# Altium footprint library PcbLib1.PcbLib: 157 footprints (part 1 of 10)
Each footprint in its own frame and in the unit in brackets; x right, y up, seen from the top. Pads: shape width x height; smd on the part's side, far side on the other; paste and mask are expansions set on the pad; w line width, h text height; cw(c..) or ccw(c..) is an arc to the next point about the centre after c.
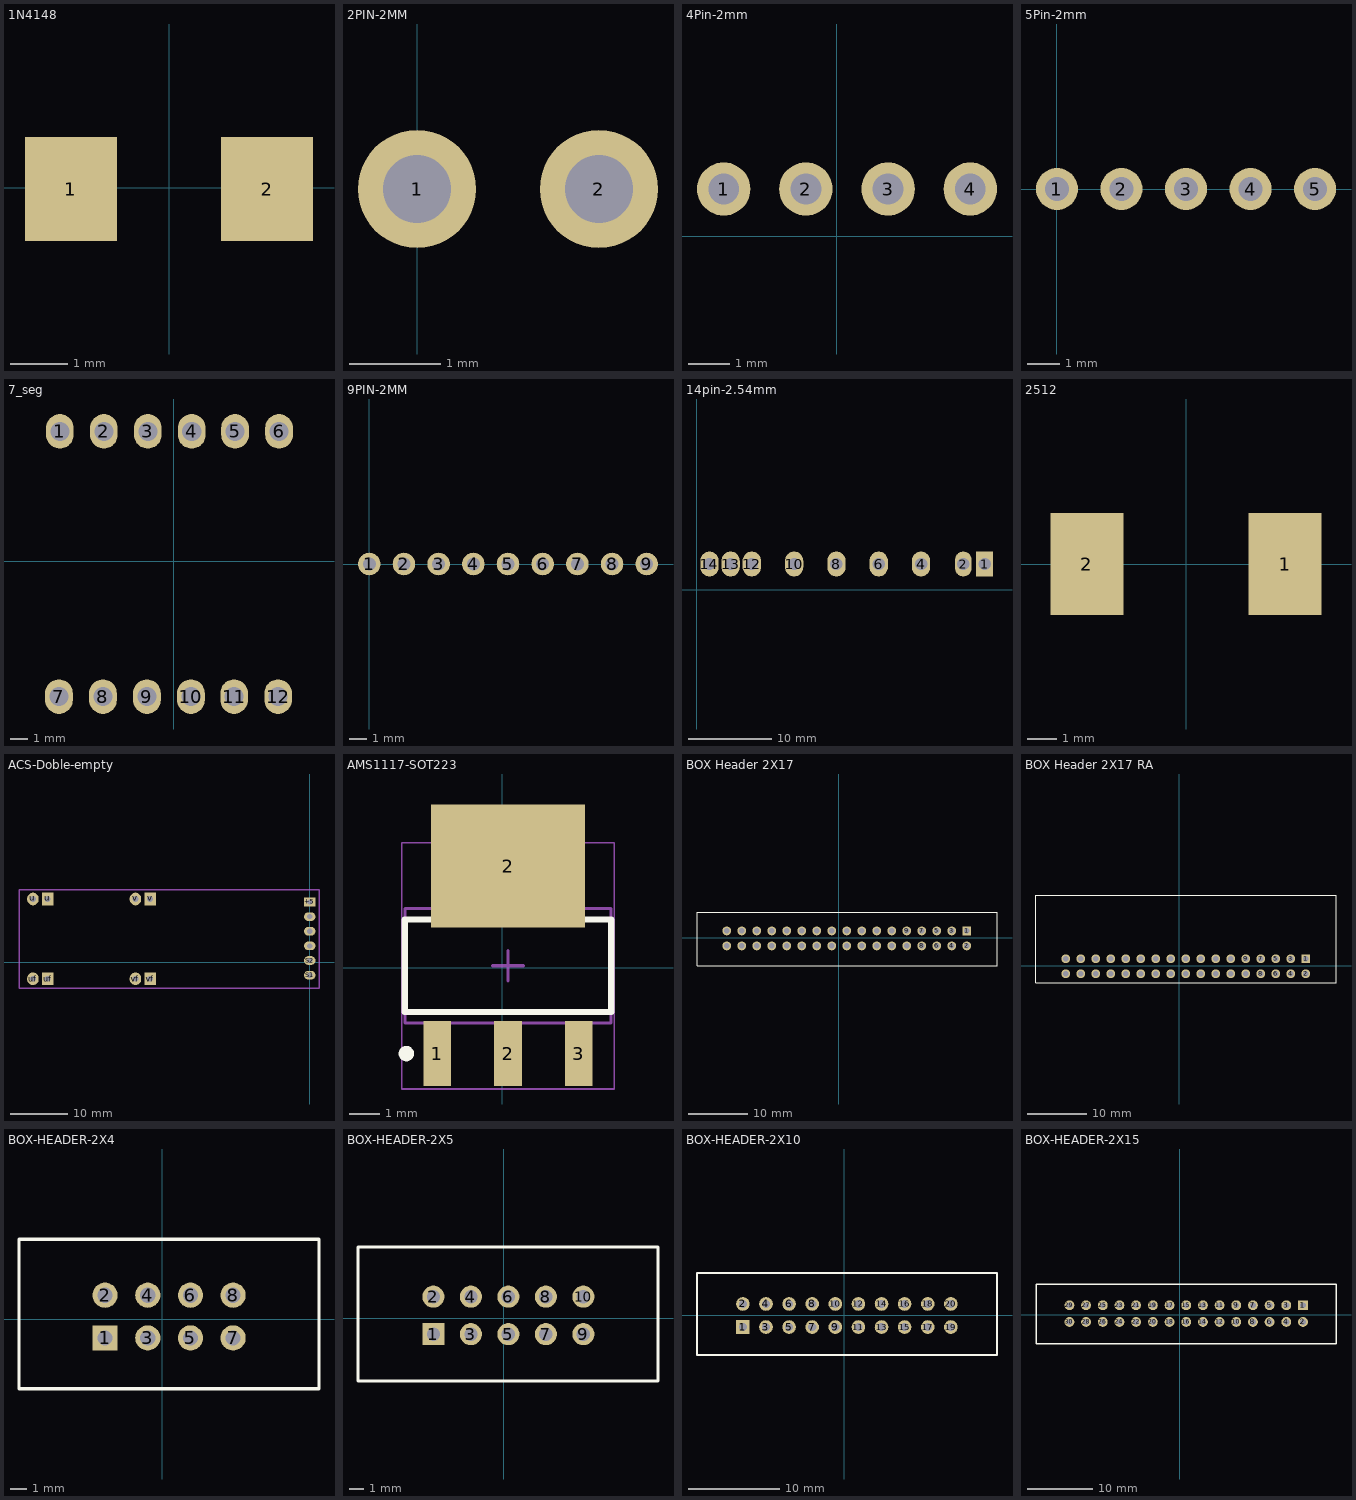
[diagram p0: the footprints below, top view; thin cyan lines are the x and y axes]

## 1N4148 [mm]
pads (2):
  rect 1.6x1.8 smd paste-25.4: 1(-1.7,-0.025) 2(1.7,-0.025)
3D body "User Library-MiniMelf-2.STEP": height 1.6, standoff 0, extent -1.85,-0.813 1.85,0.787

## 2PIN-2MM [mm]
pads (2):
  round 1.3 hole 0.75: 1(0,-1.95) 2(2,-1.95)

## 4Pin-2mm [mm]
pads (4):
  round 1.3 hole 0.75: 1(-2.75,1.15) 2(-0.75,1.15) 3(1.25,1.15) 4(3.25,1.15)

## 5Pin-2mm [mm]
pads (5):
  round 1.3 hole 0.75: 1(0,0) 2(2,0) 3(4,0) 4(6,0) 5(8,0)

## 7_seg [mm]
pads (12):
  oval 1.6x2 hole 1.1: 1(-6.58,7.5) 2(-4.04,7.5) 3(-1.5,7.5) 4(1.04,7.5) 5(3.54,7.5) 6(6.08,7.5) 7(-6.63,-7.825) 8(-4.09,-7.825) 9(-1.55,-7.825) 10(0.99,-7.825) 11(3.49,-7.825) 12(6.03,-7.825)
3D body "User Library-C-564 (7 segment 4 digit LED display).STEP": height 11, standoff -3.2, extent -25.425,-9.675 24.975,9.325

## 9PIN-2MM [mm]
pads (9):
  round 1.3 hole 0.75: 1(0,0) 2(2,0) 3(4,0) 4(6,0) 5(8,0) 6(10,0) 7(12,0) 8(14,0) 9(16,0)

## 14pin-2.54mm [mm]
pads (9):
  rect 2x3 hole 1.5: 1(34.574,3.085)
  oval 2x3 hole 1.5: 2(32.034,3.085)
  oval 2.2x3 hole 1.5: 4(26.954,3.085) 6(21.874,3.085) 8(16.794,3.085) 10(11.714,3.085) 12(6.634,3.085) 13(4.094,3.085) 14(1.554,3.085)

## 2512 [mm]
pads (2):
  rect 2.5x3.5 smd: 1(3.4,0) 2(-3.4,0)
3D body "User Library-Resistor SMD 2512.STEP": height 0.65, standoff 0, extent -3.2,-1.6 3.2,1.6

## ACS-Doble-empty [mm]
pads (14):
  rect 2x1.5 hole 0.9: +5(0,10.475)
  oval 2x1.5 hole 0.9: +15(0,5.395) -12(0,2.855) GND(0,7.935) S1(0,-2.225) S2(0,0.315)
  oval 2x2.2 hole 1: u(-48.011,10.988) uf(-48.011,-2.855) v(-30.231,10.988) vf(-30.231,-2.855)
  rect 2x2.2 hole 1: u(-45.471,10.988) uf(-45.471,-2.855) v(-27.691,10.988) vf(-27.691,-2.855)
Bottom Overlay:
  lines w0.2: -49.281,-4.125 -49.281,-1.585 -44.201,-1.585 -44.201,-4.125 -49.281,-4.125 ; -49.281,9.718 -49.281,12.258 -44.201,12.258 -44.201,9.718 -49.281,9.718 ; -31.501,-4.125 -31.501,-1.585 -26.421,-1.585 -26.421,-4.125 -31.501,-4.125 ; -31.501,9.718 -31.501,12.258 -26.421,12.258 -26.421,9.718 -31.501,9.718
Mechanical 13:
  lines w0.254: -50.424,-4.475 1.6,-4.475 1.6,12.575 -50.424,12.575 -50.424,-4.475
3D body "User Library-Header_Male_2Pin.STEP": height 8.54, standoff -3, extent -49.281,9.743 -44.201,12.233
3D body "User Library-Header_Male_2Pin.STEP": height 8.54, standoff -3, extent -49.281,-4.1 -44.201,-1.61
3D body "User Library-Header_Male_2Pin.STEP": height 8.54, standoff -3, extent -31.501,9.743 -26.421,12.233
3D body "User Library-Header_Male_2Pin.STEP": height 8.54, standoff -3, extent -31.501,-4.1 -26.421,-1.61

## AMS1117-SOT223 [mm]
pads (4):
  rect 0.9x2.1 smd: 1(-2.108,-2.789) 2(0.192,-2.789) 3(2.492,-2.789)
  rect 5x4 smd: 2(0.192,3.3)
Top Overlay:
  circle w0.25: c-3.108,-2.789 r0.125
  lines w0.2: -3.158,-1.439 3.542,-1.439 3.542,1.561 -3.158,1.561 -3.158,-1.439
Mechanical 13:
  lines w0.1: -3.158,-1.794 3.542,-1.794 3.542,1.916 -3.158,1.916 -3.158,-1.794
Mechanical 15:
  lines w0.05: -3.258,-3.939 3.642,-3.939 3.642,4.061 -3.258,4.061 -3.258,-3.939
  lines w0.1: -0.308,0.061 0.692,0.061 ; 0.192,-0.439 0.192,0.561
3D body "User Library-AMS1117-1.STEP": height 1.8, standoff -0.06, extent -3.074,-3.551 3.431,3.449

## BOX Header 2X17 [mm]
pads (34):
  rect 1.5x1.5 hole 0.9: 1(21.706,1.147)
  round 1.5 hole 0.9: 2(21.706,-1.393) 3(19.166,1.147) 4(19.166,-1.393) 5(16.626,1.147) 6(16.626,-1.393) 7(14.086,1.147) 8(14.086,-1.393) 9(11.546,1.147) 10(11.546,-1.393) 11(9.006,1.147) 12(9.006,-1.393) 13(6.466,1.147) 14(6.466,-1.393) 15(3.926,1.147) 16(3.926,-1.393) 17(1.386,1.147) 18(1.386,-1.393) 19(-1.154,1.147) 20(-1.154,-1.393) 21(-3.694,1.147) 22(-3.694,-1.393) 23(-6.234,1.147) 24(-6.234,-1.393) 25(-8.774,1.147) 26(-8.774,-1.393) 27(-11.314,1.147) 28(-11.314,-1.393) 29(-13.854,1.147) 30(-13.854,-1.393) 31(-16.394,1.147) 32(-16.394,-1.393) 33(-18.934,1.147) 34(-18.934,-1.393)
Top Overlay:
  lines w0.2: -23.975,-4.75 26.825,-4.75 26.825,4.3 -23.975,4.3 -23.975,-4.75
3D body "71071391.stp": height 9.43, standoff -2.68, extent -24.04,-4.825 26.8,4.275

## BOX Header 2X17 RA [mm]
pads (34):
  rect 1.5x1.5 hole 0.9: 1(21.406,1.197)
  round 1.5 hole 0.9: 2(21.406,-1.343) 3(18.866,1.197) 4(18.866,-1.343) 5(16.326,1.197) 6(16.326,-1.343) 7(13.786,1.197) 8(13.786,-1.343) 9(11.246,1.197) 10(11.246,-1.343) 11(8.706,1.197) 12(8.706,-1.343) 13(6.166,1.197) 14(6.166,-1.343) 15(3.626,1.197) 16(3.626,-1.343) 17(1.086,1.197) 18(1.086,-1.343) 19(-1.454,1.197) 20(-1.454,-1.343) 21(-3.994,1.197) 22(-3.994,-1.343) 23(-6.534,1.197) 24(-6.534,-1.343) 25(-9.074,1.197) 26(-9.074,-1.343) 27(-11.614,1.197) 28(-11.614,-1.343) 29(-14.154,1.197) 30(-14.154,-1.343) 31(-16.694,1.197) 32(-16.694,-1.343) 33(-19.234,1.197) 34(-19.234,-1.343)
Top Overlay:
  lines w0.2: -24.275,-2.825 -24.275,11.925 26.525,11.925 26.525,-2.825 -24.275,-2.825
3D body "71071384.stp": height 9.43, standoff -2.4, extent -24.315,-1.675 26.525,11.875

## BOX-HEADER-2X4 [mm]
pads (8):
  rect 1.5x1.5 hole 0.9: 1(-3.404,-1.122)
  round 1.5 hole 0.9: 2(-3.404,1.418) 3(-0.864,-1.122) 4(-0.864,1.418) 5(1.676,-1.122) 6(1.676,1.418) 7(4.216,-1.122) 8(4.216,1.418)
Top Overlay:
  lines w0.2: -8.525,-4.15 9.325,-4.15 9.325,4.75 -8.525,4.75 -8.525,-4.15
3D body "612008235121.stp": height 9.4, standoff -2.6, extent -8.495,-4.225 9.325,4.825

## BOX-HEADER-2X5 [mm]
pads (10):
  rect 1.5x1.5 hole 0.9: 1(-4.766,-1.091)
  round 1.5 hole 0.9: 2(-4.766,1.449) 3(-2.226,-1.091) 4(-2.226,1.449) 5(0.314,-1.091) 6(0.314,1.449) 7(2.854,-1.091) 8(2.854,1.449) 9(5.394,-1.091) 10(5.394,1.449)
Top Overlay:
  lines w0.2: -9.875,-4.25 -9.875,4.8 10.45,4.8 10.45,-4.25 -9.875,-4.25
3D body "612010235121.stp": height 9.4, standoff -2.6, extent -9.88,-4.225 10.48,4.825

## BOX-HEADER-2X10 [mm]
pads (20):
  rect 1.5x1.5 hole 0.9: 1(-11.159,-1.274)
  round 1.5 hole 0.9: 2(-11.159,1.266) 3(-8.619,-1.274) 4(-8.619,1.266) 5(-6.079,-1.274) 6(-6.079,1.266) 7(-3.539,-1.274) 8(-3.539,1.266) 9(-0.999,-1.274) 10(-0.999,1.266) 11(1.541,-1.274) 12(1.541,1.266) 13(4.081,-1.274) 14(4.081,1.266) 15(6.621,-1.274) 16(6.621,1.266) 17(9.161,-1.274) 18(9.161,1.266) 19(11.701,-1.274) 20(11.701,1.266)
Top Overlay:
  lines w0.2: -16.204,-4.35 16.775,-4.35 16.775,4.675 -16.204,4.675 -16.204,-4.35
3D body "612020235121.stp": height 9.4, standoff -2.6, extent -16.275,-4.375 16.785,4.675

## BOX-HEADER-2X15 [mm]
pads (30):
  rect 1.5x1.5 hole 0.9: 1(18.749,1.456)
  round 1.5 hole 0.9: 2(18.749,-1.084) 3(16.209,1.456) 4(16.209,-1.084) 5(13.669,1.456) 6(13.669,-1.084) 7(11.129,1.456) 8(11.129,-1.084) 9(8.589,1.456) 10(8.589,-1.084) 11(6.049,1.456) 12(6.049,-1.084) 13(3.509,1.456) 14(3.509,-1.084) 15(0.969,1.456) 16(0.969,-1.084) 17(-1.571,1.456) 18(-1.571,-1.084) 19(-4.111,1.456) 20(-4.111,-1.084) 21(-6.651,1.456) 22(-6.651,-1.084) 23(-9.191,1.456) 24(-9.191,-1.084) 25(-11.731,1.456) 26(-11.731,-1.084) 27(-14.271,1.456) 28(-14.271,-1.084) 29(-16.811,1.456) 30(-16.811,-1.084)
Top Overlay:
  lines w0.2: -21.9,-4.375 23.775,-4.375 23.775,4.625 -21.9,4.625 -21.9,-4.375
3D body "User Library-BH_30_V.STEP": height 8.9, standoff -3.2, extent -21.87,-4.45 23.85,4.65